# Altium footprint library 9-Pcblib_Con.PcbLib: 266 footprints (part 9 of 17)
Each footprint in its own frame and in the unit in brackets; x right, y up, seen from the top. Pads: shape width x height; smd on the part's side, far side on the other; paste and mask are expansions set on the pad; w line width, h text height; cw(c..) or ccw(c..) is an arc to the next point about the centre after c.
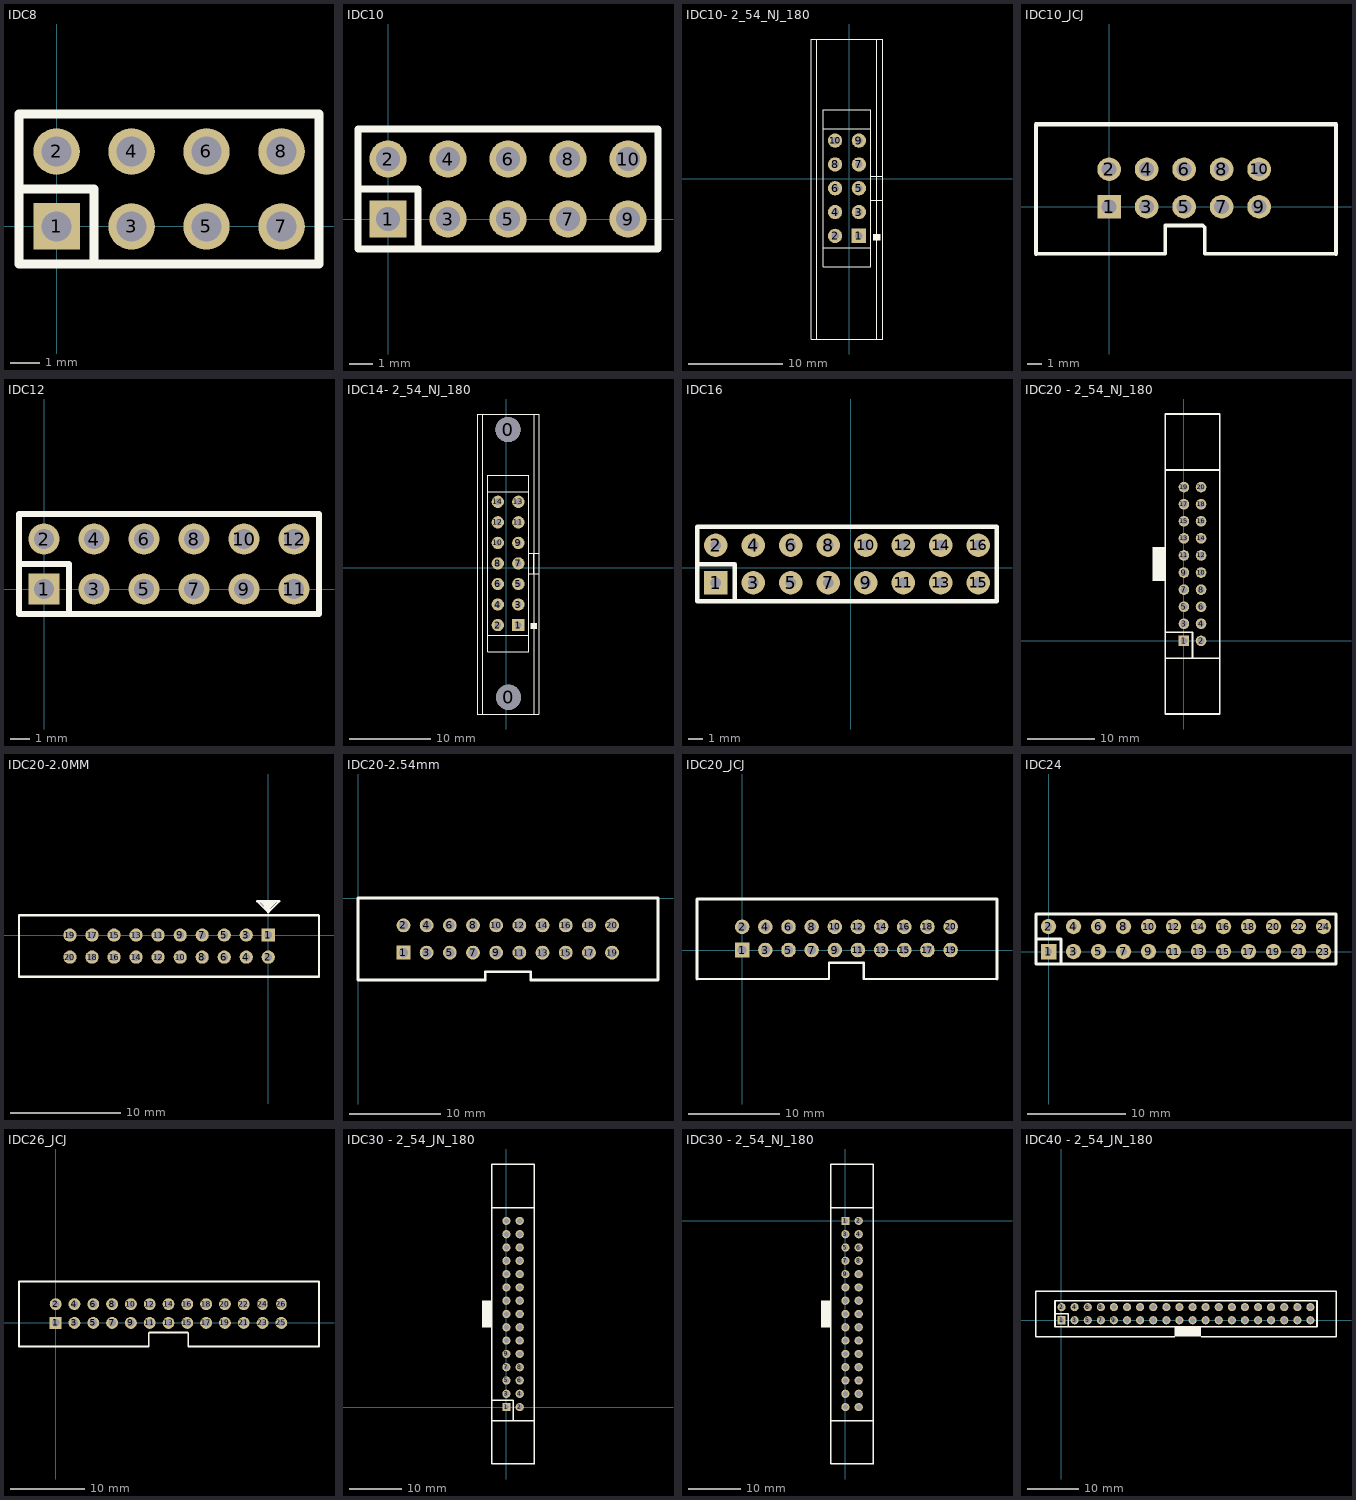
[diagram p8: the footprints below, top view; thin cyan lines are the x and y axes]

## IDC8 [mil]
pads (8):
  rect 62x62 hole 39.37: 1(0,0)
  round 62 hole 39.37: 2(0,100) 3(100,0) 4(100,100) 5(200,0) 6(200,100) 7(300,0) 8(300,100)
Top Overlay:
  lines w12: -50,50 50,50 50,-50 ; -50,-50 -50,150 350,150 350,-50 -50,-50

## IDC10 [mil]
pads (10):
  rect 62x62 hole 39.37: 1(0,0)
  round 62 hole 39.37: 2(0,100) 3(100,0) 4(100,100) 5(200,0) 6(200,100) 7(300,0) 8(300,100) 9(400,0) 10(400,100)
Top Overlay:
  lines w12: -50,50 50,50 50,-50 ; -50,-50 450,-50 450,150 -50,150 -50,-50

## IDC10- 2_54_NJ_180 [mil]
pads (12):
  round 0 all layers, no hole: 0(-7.63,-591.38) 0(-7.63,510.98)
  rect 60x60 hole 32: 1(39.61,-240)
  round 60 hole 32: 2(-60.39,-240) 3(39.61,-140) 4(-60.39,-140) 5(39.61,-40) 6(-60.39,-40) 7(39.61,60) 8(-60.39,60) 9(39.61,160) 10(-60.39,160)
Top Overlay:
  rectangle: 99.65,-259.69 130.17,-231.14
  lines w3: -160.39,-673.07 -160.39,586.77 ; -160.19,-673.07 139.81,-673.07 ; -160.19,586.77 139.81,586.77 ; -136.39,-673.07 -136.39,586.77 ; 89.61,-90 114.61,-90 ; 89.61,10 119.61,10 ; 114.61,-673.07 114.61,586.77 ; 139.61,-673.07 139.61,586.77 ; 139.61,-90 114.61,-90 ; 139.61,10 114.61,10 114.61,-90 ; -110.39,-290 89.61,-290 ; -110.39,-290 -110.39,210 ; -110.39,-290 -110.39,-370 89.61,-370 89.61,-290 ; -110.39,210 89.61,210 ; -110.39,210 -110.39,290 89.61,290 89.61,210 ; 89.61,-290 89.61,210

## IDC10_JCJ [mm]
height 0.6
pads (10):
  rect 1.6x1.6 hole 1: 1(0,0)
  round 1.6 hole 1: 2(0,2.54) 3(2.54,0) 4(2.54,2.54) 5(5.08,0) 6(5.08,2.54) 7(7.62,0) 8(7.62,2.54) 9(10.16,0) 10(10.16,2.54)
Top Overlay:
  lines w0.254: -4.953,-3.175 3.81,-3.175 3.81,-1.27 6.35,-1.27 6.477,-1.397 6.477,-3.175 15.372,-3.175
  lines w0.305: -4.953,-3.175 -4.953,5.588 15.372,5.588 15.372,-3.175
3D body: height 9.86, standoff -3.05, extent -4.978,-3.302 15.342,5.842

## IDC12 [mil]
pads (12):
  rect 62x62 hole 39.37: 1(0,0)
  round 62 hole 39.37: 2(0,100) 3(100,0) 4(100,100) 5(200,0) 6(200,100) 7(300,0) 8(300,100) 9(400,0) 10(400,100) 11(500,0) 12(500,100)
Top Overlay:
  lines w12: -50,50 50,50 50,-50 ; -50,-50 -50,150 550,150 550,-50 -50,-50

## IDC14- 2_54_NJ_180 [mil]
pads (16):
  round 122.05 hole 122.05: 0(9.65,671.38) 0(12.41,-631.38)
  rect 60x60 hole 30: 1(59.65,-280)
  round 60 hole 30: 2(-40.35,-280) 3(59.65,-180) 4(-40.35,-180) 5(59.65,-80) 6(-40.35,-80) 7(59.65,20) 8(-40.35,20) 9(59.65,120) 10(-40.35,120) 11(59.65,220) 12(-40.35,220) 13(59.65,320) 14(-40.35,320)
Top Overlay:
  rectangle: 119.69,-299.68 150.2,-271.14
  lines w3: -140.35,-713.07 -141.13,747.56 159.06,747.56 159.65,-713.07 ; -140.15,-713.07 159.85,-713.07 ; -116.53,747.17 -116.35,-713.07 ; 109.65,-30.98 134.65,-30.98 ; 109.65,69.02 139.65,69.02 ; 134.46,747.17 134.65,-713.07 ; 159.65,-30.98 134.65,-30.98 ; 159.65,69.02 134.65,69.02 134.65,-30.98 ; -90.35,-330 -90.35,-410 109.65,-410 109.65,-330 ; -90.35,-330 -90.35,369.61 ; -90.35,-330 109.65,-330 ; -90.35,369.61 -90.35,449.61 109.65,449.61 109.65,369.61 ; -90.35,369.61 109.65,369.61 ; 109.65,-330 109.65,369.61

## IDC16 [mil]
pads (16):
  rect 62x62 hole 28: 1(-360,-40)
  round 62 hole 28: 2(-360,60) 3(-260,-40) 4(-260,60) 5(-160,-40) 6(-160,60) 7(-60,-40) 8(-60,60) 9(40,-40) 10(40,60) 11(140,-40) 12(140,60) 13(240,-40) 14(240,60) 15(340,-40) 16(340,60)
Top Overlay:
  lines w12: -410,10 -310,10 -310,-90 ; -410,-90 390,-90 390,110 -410,110 -410,-90

## IDC20 - 2_54_NJ_180 [mil]
pads (20):
  rect 62x62 hole 39: 1(0,0)
  round 62 hole 39: 2(100,0) 3(0,100) 4(100,100) 5(0,200) 6(100,200) 7(0,300) 8(100,300) 9(0,400) 10(100,400) 11(0,500) 12(100,500) 13(0,600) 14(100,600) 15(0,700) 16(100,700) 17(0,800) 18(100,800) 19(0,900) 20(100,900)
Top Overlay:
  rectangle: -185,350 -110,550
  lines w10: -109.06,-101 209.06,-101 ; -109.06,50 50,50 50,-100 ; -109.06,1000 209.06,1000 ; -109.06,-427.95 -109.06,1327.95 209.06,1327.95 209.06,-427.95 -109.06,-427.95

## IDC20-2.0MM [mm]
pads (20):
  rect 1.2x1.2 hole 0.7: 1(0,0)
  round 1.2 hole 0.7: 2(0,-2) 3(-2,0) 4(-2,-2) 5(-4,0) 6(-4,-2) 7(-6,0) 8(-6,-2) 9(-8,0) 10(-8,-2) 11(-10,0) 12(-10,-2) 13(-12,0) 14(-12,-2) 15(-14,0) 16(-14,-2) 17(-16,0) 18(-16,-2) 19(-18,0) 20(-18,-2)
Top Overlay:
  lines w0.2: -22.626,-3.322 -22.626,1.678 ; -21.051,-3.779 2.949,-3.779 ; -21.002,1.803 2.998,1.803 ; 4.602,-3.781 4.602,1.219 ; -1,3.073 0,2.073 1,3.073 -1,3.073
  lines w0.203: -22.626,-3.322 -22.626,-3.775 -22.621,-3.779 -21.051,-3.779 ; -22.626,1.678 -22.626,1.827 ; -22.602,1.803 -22.145,1.803 ; -22.449,1.803 -21.002,1.803 ; -0.732,3.073 0.055,2.286 0.055,2.438 0.08,2.438 0.715,3.073 0.69,3.073 0.233,2.616 0.207,2.59 -0.097,2.59 -0.428,2.921 -0.428,3.073 0.055,2.59 0.08,2.59 0.284,2.794 0.284,3.073 0.182,3.073 -0.021,2.87 -0.021,2.921 -0.174,3.073 -0.174,3.022 0.055,2.794 0.157,2.794 0.436,3.073 0.131,3.073 ; 2.949,-3.779 2.951,-3.781 4.602,-3.781 ; 2.998,1.803 4.551,1.803 4.602,1.752 4.602,1.219

## IDC20-2.54mm [mil]
pads (20):
  rect 60x60 hole 40: 1(196.85,-236.22)
  round 60 hole 40: 2(196.85,-118.11) 3(297.24,-236.22) 4(297.24,-118.11) 5(397.64,-236.22) 6(397.64,-118.11) 7(498.03,-236.22) 8(498.03,-118.11) 9(598.43,-236.22) 10(598.43,-118.11) 11(698.82,-236.22) 12(698.82,-118.11) 13(799.21,-236.22) 14(799.21,-118.11) 15(899.61,-236.22) 16(899.61,-118.11) 17(1000,-236.22) 18(1000,-118.11) 19(1100.39,-236.22) 20(1100.39,-118.11)
Top Overlay:
  lines w12: 0,-354.33 0,0 1299.21,0 1299.21,-354.33 748.03,-354.33 748.03,-318.82 551.18,-318.82 551.18,-354.33 0,-354.33

## IDC20_JCJ [mm]
height 0.6
pads (20):
  rect 1.6x1.6 hole 1: 1(0,0)
  round 1.6 hole 1: 2(0,2.54) 3(2.54,0) 4(2.54,2.54) 5(5.08,0) 6(5.08,2.54) 7(7.62,0) 8(7.62,2.54) 9(10.16,0) 10(10.16,2.54) 11(12.7,0) 12(12.7,2.54) 13(15.24,0) 14(15.24,2.54) 15(17.78,0) 16(17.78,2.54) 17(20.32,0) 18(20.32,2.54) 19(22.86,0) 20(22.86,2.54)
Top Overlay:
  lines w0.254: -4.953,-3.175 9.525,-3.175 9.525,-1.397 13.335,-1.397 13.335,-3.175 27.945,-3.175
  lines w0.305: -4.953,-3.175 -4.953,5.588 27.945,5.588 27.945,-3.175
3D body: height 8.95, standoff -2.9, extent -5.055,-3.283 27.965,5.817

## IDC24 [mil]
pads (24):
  rect 62x62 hole 28: 1(0,0)
  round 62 hole 28: 2(0,100) 3(100,0) 4(100,100) 5(200,0) 6(200,100) 7(300,0) 8(300,100) 9(400,0) 10(400,100) 11(500,0) 12(500,100) 13(600,0) 14(600,100) 15(700,0) 16(700,100) 17(800,0) 18(800,100) 19(900,0) 20(900,100) 21(1000,0) 22(1000,100) 23(1100,0) 24(1100,100)
Top Overlay:
  lines w12: -50,50 50,50 50,-50 ; -50,-50 -50,150 1150,150 1150,-50 -50,-50

## IDC26_JCJ [mm]
height 0.6
pads (26):
  rect 1.6x1.6 hole 1: 1(0,0)
  round 1.6 hole 1: 2(0,2.54) 3(2.54,0) 4(2.54,2.54) 5(5.08,0) 6(5.08,2.54) 7(7.62,0) 8(7.62,2.54) 9(10.16,0) 10(10.16,2.54) 11(12.7,0) 12(12.7,2.54) 13(15.24,0) 14(15.24,2.54) 15(17.78,0) 16(17.78,2.54) 17(20.32,0) 18(20.32,2.54) 19(22.86,0) 20(22.86,2.54) 21(25.4,0) 22(25.4,2.54) 23(27.94,0) 25(30.48,0)
  oval 1.4x1.6 hole 1: 24(27.94,2.54) 26(30.48,2.54)
Top Overlay:
  lines w0.254: -4.953,-3.175 12.573,-3.175 12.573,-1.397 12.7,-1.27 17.78,-1.27 17.907,-1.397 17.907,-3.175 35.565,-3.175
  lines w0.305: -4.953,-3.175 -4.953,5.588 35.565,5.588 35.565,-3.175
3D body: height 9.1, standoff -2.7, extent -4.943,-3.277 35.677,5.523

## IDC30 - 2_54_JN_180 [mil]
pads (30):
  rect 62x62 hole 39: 1(0,0)
  round 62 hole 39: 2(100,0) 3(0,100) 4(100,100) 5(0,200) 6(100,200) 7(0,300) 8(100,300) 9(0,400) 10(100,400) 11(0,500) 12(100,500) 13(0,600) 14(100,600) 15(0,700) 16(100,700) 17(0,800) 18(100,800) 19(0,900) 20(100,900) 21(0,1000) 22(100,1000) 23(0,1100) 24(100,1100) 25(0,1200) 26(100,1200) 27(0,1300) 28(100,1300) 29(0,1400) 30(100,1400)
Top Overlay:
  rectangle: -185,600 -110,800
  lines w10: -109.06,-101 209.06,-101 ; -109.06,50 50,50 50,-100 ; -109.06,1500 209.06,1500 ; -109.06,-427.95 209.05,-427.95 209.06,1827.95 -109.06,1827.95 -109.06,-427.95
3D body: height 359.45, standoff -128.74, extent -117.31,-199.6 231.11,1599.61

## IDC30 - 2_54_NJ_180 [mil]
pads (30):
  rect 62x62 hole 39: 1(0,0)
  round 62 hole 39: 2(100,0) 3(0,-100) 4(100,-100) 5(0,-200) 6(100,-200) 7(0,-300) 8(100,-300) 9(0,-400) 10(100,-400) 11(0,-500) 12(100,-500) 13(0,-600) 14(100,-600) 15(0,-700) 16(100,-700) 17(0,-800) 18(100,-800) 19(0,-900) 20(100,-900) 21(0,-1000) 22(100,-1000) 23(0,-1100) 24(100,-1100) 25(0,-1200) 26(100,-1200) 27(0,-1300) 28(100,-1300) 29(0,-1400) 30(100,-1400)
Top Overlay:
  rectangle: -185,-800 -110,-600
  lines w10: -109.06,-1501 209.06,-1501 ; -109.06,100 209.06,100 ; -109.06,-1827.95 -109.06,427.95 209.06,427.95 209.06,-1827.95 -109.06,-1827.95
3D body: height 1055.06, standoff -125.59, extent -110.2,-1828.87 220.51,430.97

## IDC40 - 2_54_JN_180 [mil]
pads (40):
  rect 62x62 hole 39: 1(0.48,0)
  round 62 hole 39: 2(0.48,100) 3(100.48,0) 4(100.48,100) 5(200.48,0) 6(200.48,100) 7(300.48,0) 8(300.48,100) 9(400.48,0) 10(400.48,100) 11(500.48,0) 12(500.48,100) 13(600.48,0) 14(600.48,100) 15(700.48,0) 16(700.48,100) 17(800.48,0) 18(800.48,100) 19(900.48,0) 20(900.48,100) 21(1000.48,0) 22(1000.48,100) 23(1100.48,0) 24(1100.48,100) 25(1200.48,0) 26(1200.48,100) 27(1300.48,0) 28(1300.48,100) 29(1400.48,0) 30(1400.48,100) 31(1500.48,0) 32(1500.48,100) 33(1600.48,0) 34(1600.48,100) 35(1700.48,0) 36(1700.48,100) 37(1800.48,0) 38(1800.48,100) 39(1900.48,0) 40(1900.48,100)
Top Overlay:
  rectangle: 864,-125 1066,-50
  lines w10: 864,-125 -194.52,-125 -194.52,220 2095.48,220 2095.48,-125 1066,-125
  lines w12: -49.52,50 50.48,50 50.48,-50 ; -49.52,-50 -49.52,150 1950.48,150 1950.48,-50 -49.52,-50
3D body: height 359.45, standoff -128.74, extent -199.11,-117.31 2100.1,231.11